# Altium schematic symbol library LATTICEPLDS_Library.SchLib: 291 symbols (part 30 of 32)
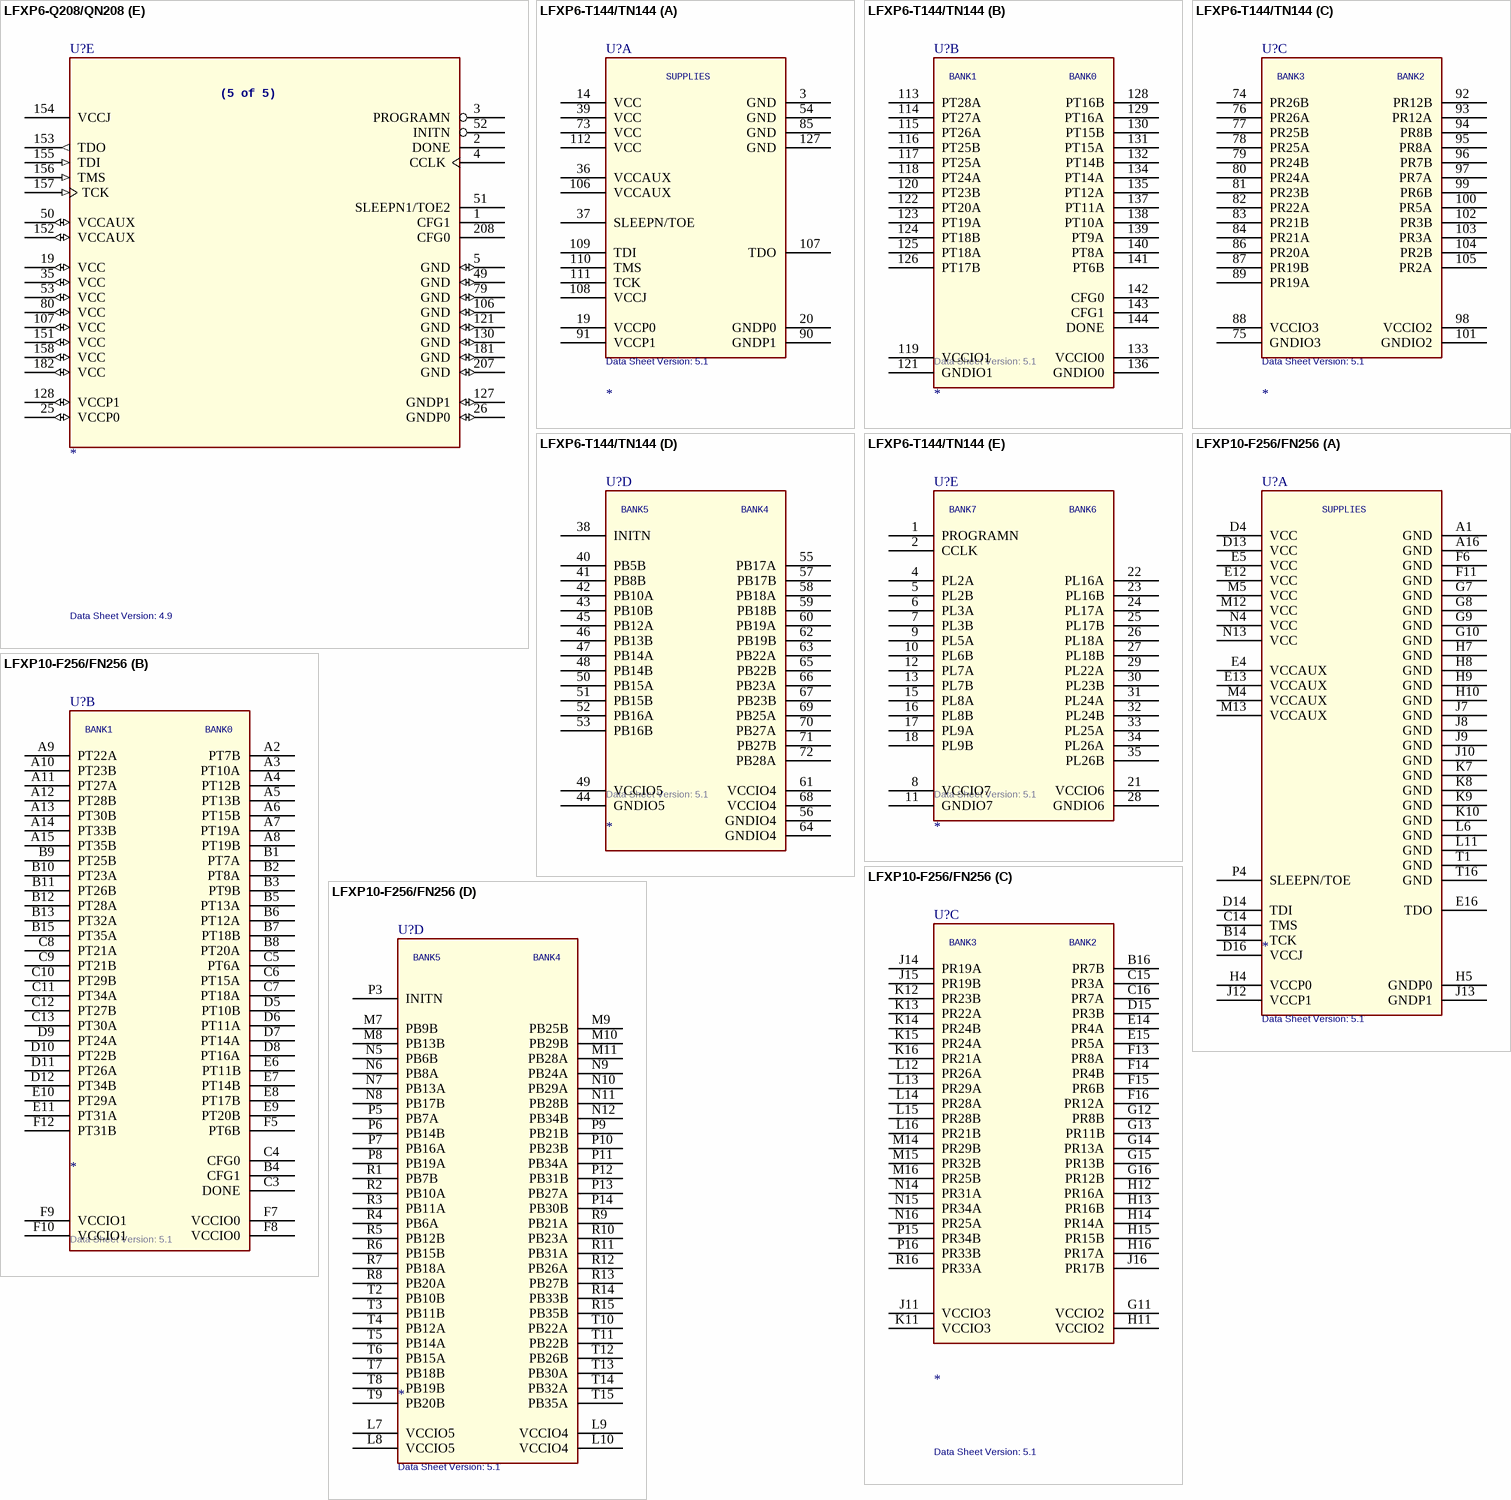
[diagram p332: symbols LFXP6-Q208/QN208 to LFXP10-F256/FN256]

## LFXP6-T144/TN144
designator U?  Data Sheet Version: 5.1
SPLIT_INST: TRUE; SWAP_INFO: (S1+S2+S3+S4+S5)
part A pins: 3 GND (power), 14 VCC (power), 19 VCCP0 (power), 20 GNDP0 (power), 36 VCCAUX (power), 37 SLEEPN/TOE, 39 VCC (power), 54 GND (power), 73 VCC (power), 85 GND (power), 90 GNDP1 (power), 91 VCCP1 (power), 106 VCCAUX (power), 107 TDO, 108 VCCJ (power), 109 TDI, 110 TMS, 111 TCK, 112 VCC (power), 127 GND (power)
part B pins: 113 PT28A, 114 PT27A, 115 PT26A, 116 PT25B, 117 PT25A, 118 PT24A, 119 VCCIO1 (power), 120 PT23B, 121 GNDIO1 (power), 122 PT20A, 123 PT19A, 124 PT18B, 125 PT18A, 126 PT17B, 128 PT16B, 129 PT16A, 130 PT15B, 131 PT15A, 132 PT14B, 133 VCCIO0 (power), 134 PT14A, 135 PT12A, 136 GNDIO0 (power), 137 PT11A, 138 PT10A, 139 PT9A, 140 PT8A, 141 PT6B, 142 CFG0, 143 CFG1, 144 DONE
part C pins: 74 PR26B, 75 GNDIO3 (power), 76 PR26A, 77 PR25B, 78 PR25A, 79 PR24B, 80 PR24A, 81 PR23B, 82 PR22A, 83 PR21B, 84 PR21A, 86 PR20A, 87 PR19B, 88 VCCIO3 (power), 89 PR19A, 92 PR12B, 93 PR12A, 94 PR8B, 95 PR8A, 96 PR7B, 97 PR7A, 98 VCCIO2 (power), 99 PR6B, 100 PR5A, 101 GNDIO2 (power), 102 PR3B, 103 PR3A, 104 PR2B, 105 PR2A
part D pins: 38 INITN, 40 PB5B, 41 PB8B, 42 PB10A, 43 PB10B, 44 GNDIO5 (power), 45 PB12A, 46 PB13B, 47 PB14A, 48 PB14B, 49 VCCIO5 (power), 50 PB15A, 51 PB15B, 52 PB16A, 53 PB16B, 55 PB17A, 56 GNDIO4 (power), 57 PB17B, 58 PB18A, 59 PB18B, 60 PB19A, 61 VCCIO4 (power), 62 PB19B, 63 PB22A, 64 GNDIO4 (power), 65 PB22B, 66 PB23A, 67 PB23B, 68 VCCIO4 (power), 69 PB25A, 70 PB27A, 71 PB27B, 72 PB28A
part E pins: 1 PROGRAMN, 2 CCLK, 4 PL2A, 5 PL2B, 6 PL3A, 7 PL3B, 8 VCCIO7 (power), 9 PL5A, 10 PL6B, 11 GNDIO7 (power), 12 PL7A, 13 PL7B, 15 PL8A, 16 PL8B, 17 PL9A, 18 PL9B, 21 VCCIO6 (power), 22 PL16A, 23 PL16B, 24 PL17A, 25 PL17B, 26 PL18A, 27 PL18B, 28 GNDIO6 (power), 29 PL22A, 30 PL23B, 31 PL24A, 32 PL24B, 33 PL25A, 34 PL26A, 35 PL26B
part A text: SUPPLIES
part B text: BANK1; BANK0
part C text: BANK3; BANK2
part D text: BANK5; BANK4
part E text: BANK7; BANK6

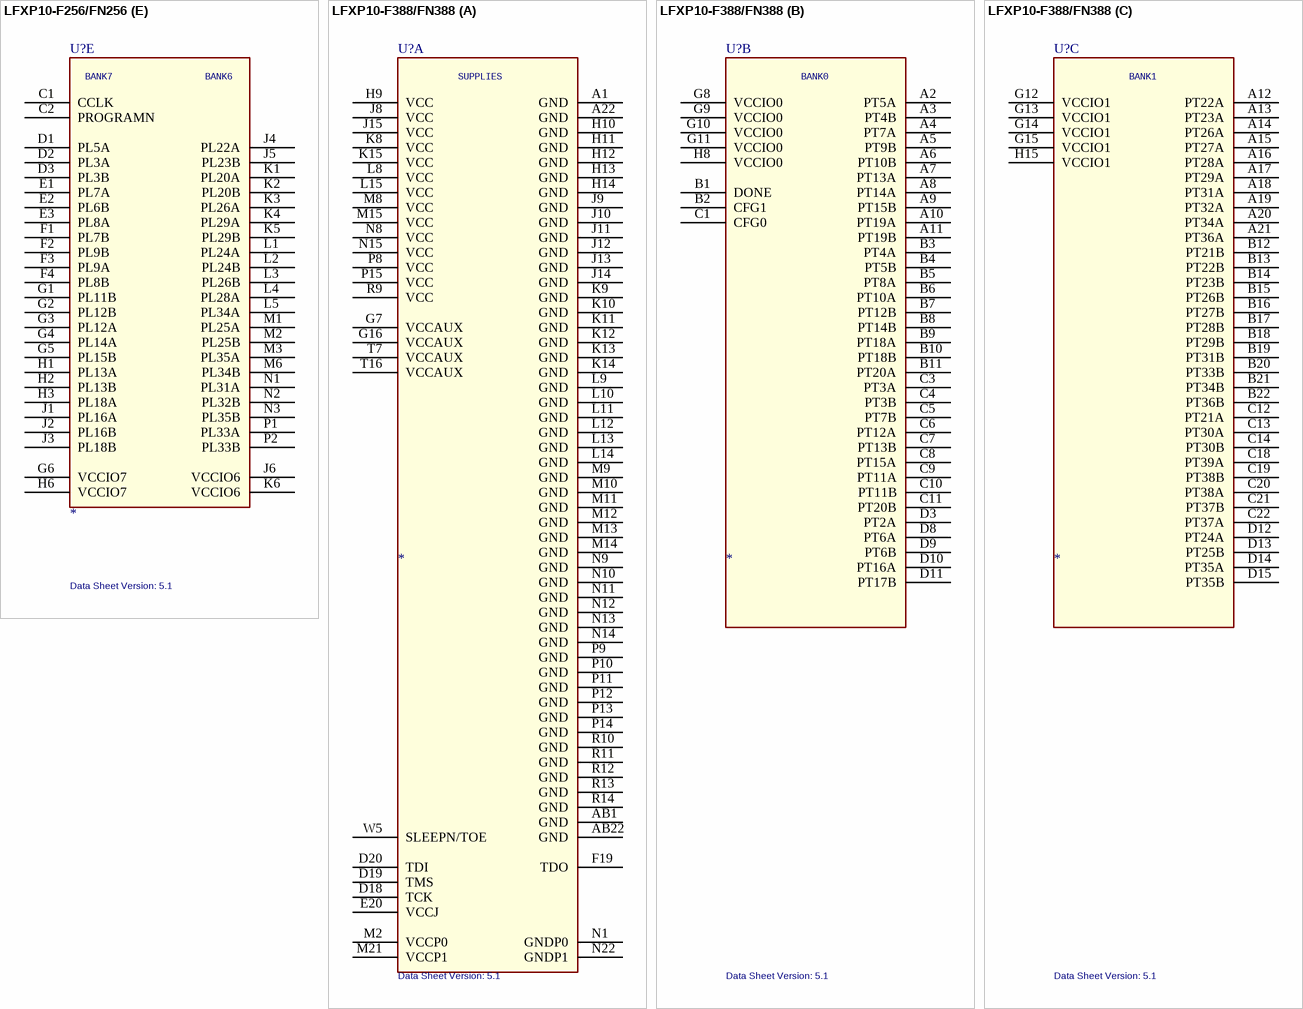
[diagram p270: symbols LFXP10-F256/FN256 to LFXP10-F388/FN388]

## LFXP10-F256/FN256
designator U?  Data Sheet Version: 5.1
SPLIT_INST: TRUE; SWAP_INFO: (S1+S2+S3+S4+S5)
part A pins: A1 GND (power), A16 GND (power), B14 TCK, C14 TMS, D4 VCC (power), D13 VCC (power), D14 TDI, D16 VCCJ (power), E4 VCCAUX (power), E5 VCC (power), E12 VCC (power), E13 VCCAUX (power), E16 TDO, F6 GND (power), F11 GND (power), G7 GND (power), G8 GND (power), G9 GND (power), G10 GND (power), H4 VCCP0 (power), H5 GNDP0 (power), H7 GND (power), H8 GND (power), H9 GND (power), H10 GND (power), J7 GND (power), J8 GND (power), J9 GND (power), J10 GND (power), J12 VCCP1 (power), J13 GNDP1 (power), K7 GND (power), K8 GND (power), K9 GND (power), K10 GND (power), L6 GND (power), L11 GND (power), M4 VCCAUX (power), M5 VCC (power), M12 VCC (power), M13 VCCAUX (power), N4 VCC (power), N13 VCC (power), P4 SLEEPN/TOE, T1 GND (power), T16 GND (power)
part B pins: A2 PT7B, A3 PT10A, A4 PT12B, A5 PT13B, A6 PT15B, A7 PT19A, A8 PT19B, A9 PT22A, A10 PT23B, A11 PT27A, A12 PT28B, A13 PT30B, A14 PT33B, A15 PT35B, B1 PT7A, B2 PT8A, B3 PT9B, B4 CFG1, B5 PT13A, B6 PT12A, B7 PT18B, B8 PT20A, B9 PT25B, B10 PT23A, B11 PT26B, B12 PT28A, B13 PT32A, B15 PT35A, C3 DONE, C4 CFG0, C5 PT6A, C6 PT15A, C7 PT18A, C8 PT21A, C9 PT21B, C10 PT29B, C11 PT34A, C12 PT27B, C13 PT30A, D5 PT10B, D6 PT11A, D7 PT14A, D8 PT16A, D9 PT24A, D10 PT22B, D11 PT26A, D12 PT34B, E6 PT11B, E7 PT14B, E8 PT17B, E9 PT20B, E10 PT29A, E11 PT31A, F5 PT6B, F7 VCCIO0 (power), F8 VCCIO0 (power), F9 VCCIO1 (power), F10 VCCIO1 (power), F12 PT31B
part C pins: B16 PR7B, C15 PR3A, C16 PR7A, D15 PR3B, E14 PR4A, E15 PR5A, F13 PR8A, F14 PR4B, F15 PR6B, F16 PR12A, G11 VCCIO2 (power), G12 PR8B, G13 PR11B, G14 PR13A, G15 PR13B, G16 PR12B, H11 VCCIO2 (power), H12 PR16A, H13 PR16B, H14 PR14A, H15 PR15B, H16 PR17A, J11 VCCIO3 (power), J14 PR19A, J15 PR19B, J16 PR17B, K11 VCCIO3 (power), K12 PR23B, K13 PR22A, K14 PR24B, K15 PR24A, K16 PR21A, L12 PR26A, L13 PR29A, L14 PR28A, L15 PR28B, L16 PR21B, M14 PR29B, M15 PR32B, M16 PR25B, N14 PR31A, N15 PR34A, N16 PR25A, P15 PR34B, P16 PR33B, R16 PR33A
part D pins: L7 VCCIO5 (power), L8 VCCIO5 (power), L9 VCCIO4 (power), L10 VCCIO4 (power), M7 PB9B, M8 PB13B, M9 PB25B, M10 PB29B, M11 PB28A, N5 PB6B, N6 PB8A, N7 PB13A, N8 PB17B, N9 PB24A, N10 PB29A, N11 PB28B, N12 PB34B, P3 INITN, P5 PB7A, P6 PB14B, P7 PB16A, P8 PB19A, P9 PB21B, P10 PB23B, P11 PB34A, P12 PB31B, P13 PB27A, P14 PB30B, R1 PB7B, R2 PB10A, R3 PB11A, R4 PB6A, R5 PB12B, R6 PB15B, R7 PB18A, R8 PB20A, R9 PB21A, R10 PB23A, R11 PB31A, R12 PB26A, R13 PB27B, R14 PB33B, R15 PB35B, T2 PB10B, T3 PB11B, T4 PB12A, T5 PB14A, T6 PB15A, T7 PB18B, T8 PB19B, T9 PB20B, T10 PB22A, T11 PB22B, T12 PB26B, T13 PB30A, T14 PB32A, T15 PB35A
part E pins: C1 CCLK, C2 PROGRAMN, D1 PL5A, D2 PL3A, D3 PL3B, E1 PL7A, E2 PL6B, E3 PL8A, F1 PL7B, F2 PL9B, F3 PL9A, F4 PL8B, G1 PL11B, G2 PL12B, G3 PL12A, G4 PL14A, G5 PL15B, G6 VCCIO7 (power), H1 PL13A, H2 PL13B, H3 PL18A, H6 VCCIO7 (power), J1 PL16A, J2 PL16B, J3 PL18B, J4 PL22A, J5 PL23B, J6 VCCIO6 (power), K1 PL20A, K2 PL20B, K3 PL26A, K4 PL29A, K5 PL29B, K6 VCCIO6 (power), L1 PL24A, L2 PL24B, L3 PL26B, L4 PL28A, L5 PL34A, M1 PL25A, M2 PL25B, M3 PL35A, M6 PL34B, N1 PL31A, N2 PL32B, N3 PL35B, P1 PL33A, P2 PL33B
part A text: SUPPLIES
part B text: BANK1; BANK0
part C text: BANK3; BANK2
part D text: BANK5; BANK4
part E text: BANK7; BANK6

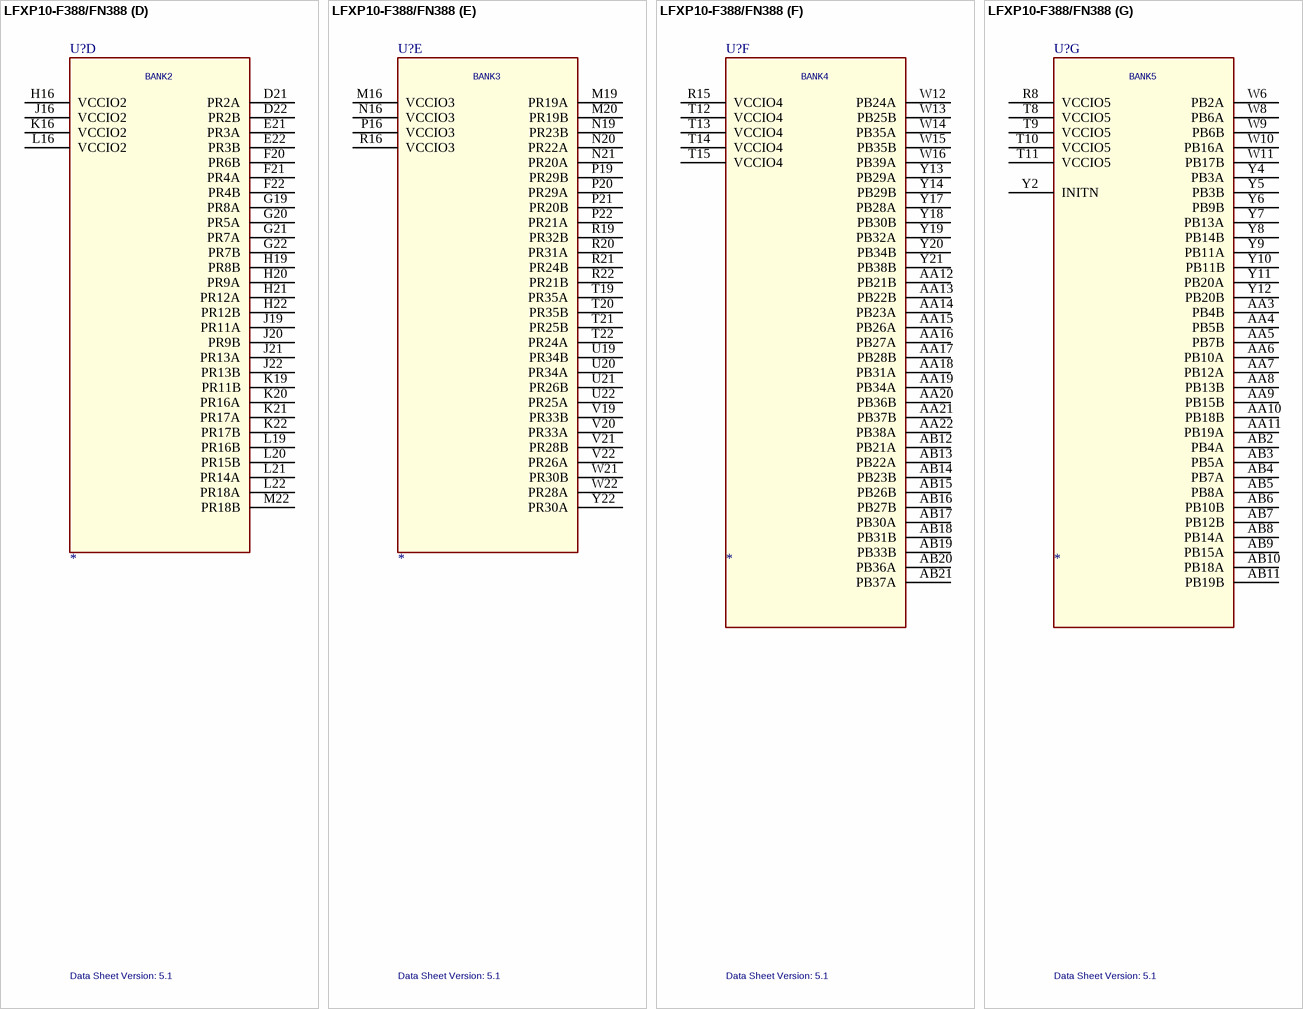
[diagram p271: symbol LFXP10-F388/FN388]

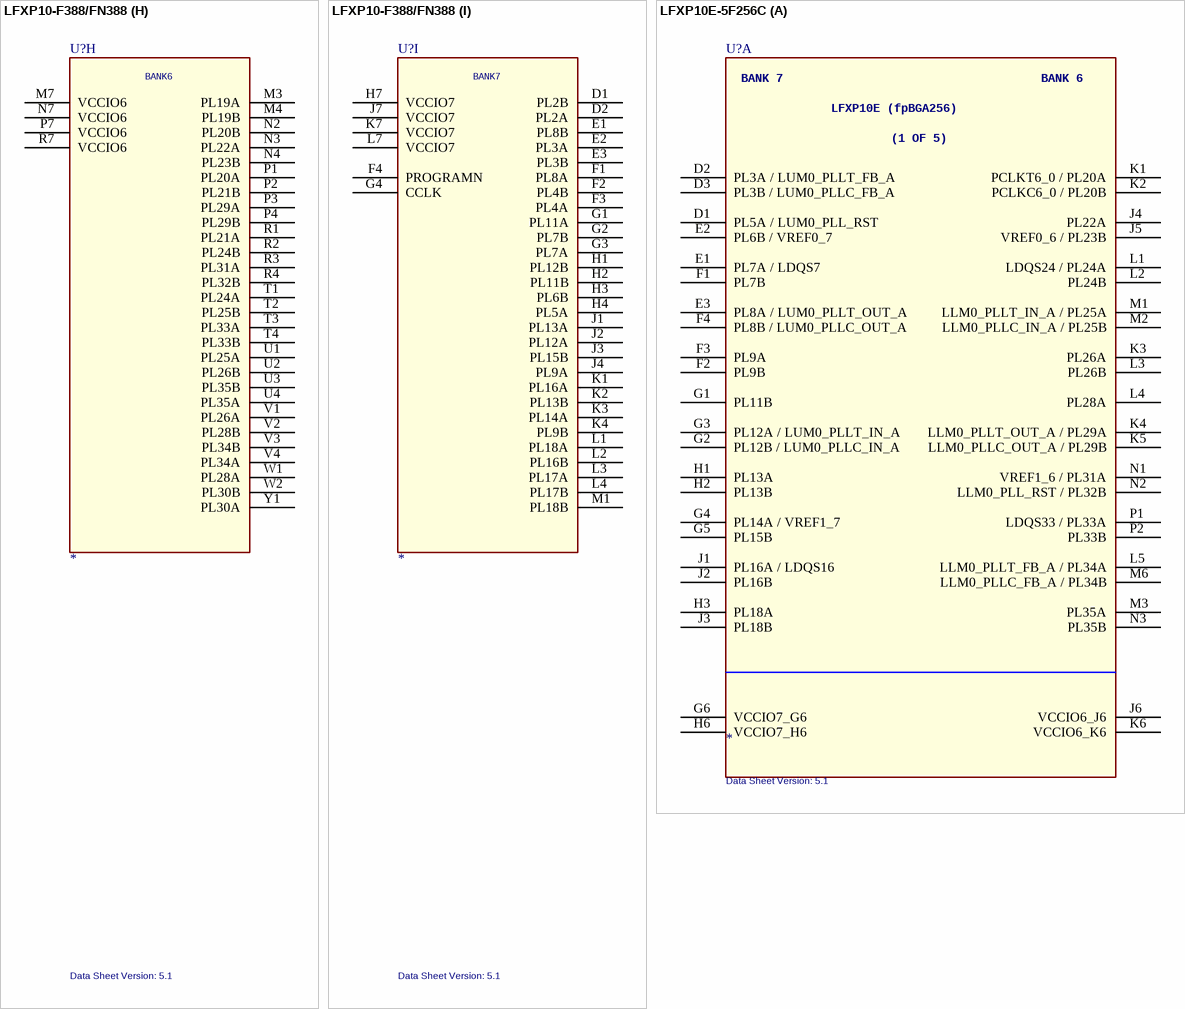
[diagram p272: symbols LFXP10-F388/FN388 to LFXP10E-5F256C]

## LFXP10-F388/FN388
designator U?  Data Sheet Version: 5.1
SPLIT_INST: TRUE; SWAP_INFO: (S1+S2+S3+S4+S5+S6+S7+S8+S9)
part A pins: A1 GND (power), A22 GND (power), AB1 GND (power), AB22 GND (power), D18 TCK, D19 TMS, D20 TDI, E20 VCCJ (power), F19 TDO, G7 VCCAUX (power), G16 VCCAUX (power), H9 VCC (power), H10 GND (power), H11 GND (power), H12 GND (power), H13 GND (power), H14 GND (power), J8 VCC (power), J9 GND (power), J10 GND (power), J11 GND (power), J12 GND (power), J13 GND (power), J14 GND (power), J15 VCC (power), K8 VCC (power), K9 GND (power), K10 GND (power), K11 GND (power), K12 GND (power), K13 GND (power), K14 GND (power), K15 VCC (power), L8 VCC (power), L9 GND (power), L10 GND (power), L11 GND (power), L12 GND (power), L13 GND (power), L14 GND (power), L15 VCC (power), M2 VCCP0 (power), M8 VCC (power), M9 GND (power), M10 GND (power), M11 GND (power), M12 GND (power), M13 GND (power), M14 GND (power), M15 VCC (power), M21 VCCP1 (power), N1 GNDP0 (power), N8 VCC (power), N9 GND (power), N10 GND (power), N11 GND (power), N12 GND (power), N13 GND (power), N14 GND (power), N15 VCC (power), N22 GNDP1 (power), P8 VCC (power), P9 GND (power), P10 GND (power), P11 GND (power), P12 GND (power), P13 GND (power), P14 GND (power), P15 VCC (power), R9 VCC (power), R10 GND (power), R11 GND (power), R12 GND (power), R13 GND (power), R14 GND (power), T7 VCCAUX (power), T16 VCCAUX (power), W5 SLEEPN/TOE
part B pins: A2 PT5A, A3 PT4B, A4 PT7A, A5 PT9B, A6 PT10B, A7 PT13A, A8 PT14A, A9 PT15B, A10 PT19A, A11 PT19B, B1 DONE, B2 CFG1, B3 PT4A, B4 PT5B, B5 PT8A, B6 PT10A, B7 PT12B, B8 PT14B, B9 PT18A, B10 PT18B, B11 PT20A, C1 CFG0, C3 PT3A, C4 PT3B, C5 PT7B, C6 PT12A, C7 PT13B, C8 PT15A, C9 PT11A, C10 PT11B, C11 PT20B, D3 PT2A, D8 PT6A, D9 PT6B, D10 PT16A, D11 PT17B, G8 VCCIO0 (power), G9 VCCIO0 (power), G10 VCCIO0 (power), G11 VCCIO0 (power), H8 VCCIO0 (power)
part C pins: A12 PT22A, A13 PT23A, A14 PT26A, A15 PT27A, A16 PT28A, A17 PT29A, A18 PT31A, A19 PT32A, A20 PT34A, A21 PT36A, B12 PT21B, B13 PT22B, B14 PT23B, B15 PT26B, B16 PT27B, B17 PT28B, B18 PT29B, B19 PT31B, B20 PT33B, B21 PT34B, B22 PT36B, C12 PT21A, C13 PT30A, C14 PT30B, C18 PT39A, C19 PT38B, C20 PT38A, C21 PT37B, C22 PT37A, D12 PT24A, D13 PT25B, D14 PT35A, D15 PT35B, G12 VCCIO1 (power), G13 VCCIO1 (power), G14 VCCIO1 (power), G15 VCCIO1 (power), H15 VCCIO1 (power)
part D pins: D21 PR2A, D22 PR2B, E21 PR3A, E22 PR3B, F20 PR6B, F21 PR4A, F22 PR4B, G19 PR8A, G20 PR5A, G21 PR7A, G22 PR7B, H16 VCCIO2 (power), H19 PR8B, H20 PR9A, H21 PR12A, H22 PR12B, J16 VCCIO2 (power), J19 PR11A, J20 PR9B, J21 PR13A, J22 PR13B, K16 VCCIO2 (power), K19 PR11B, K20 PR16A, K21 PR17A, K22 PR17B, L16 VCCIO2 (power), L19 PR16B, L20 PR15B, L21 PR14A, L22 PR18A, M22 PR18B
part E pins: M16 VCCIO3 (power), M19 PR19A, M20 PR19B, N16 VCCIO3 (power), N19 PR23B, N20 PR22A, N21 PR20A, P16 VCCIO3 (power), P19 PR29B, P20 PR29A, P21 PR20B, P22 PR21A, R16 VCCIO3 (power), R19 PR32B, R20 PR31A, R21 PR24B, R22 PR21B, T19 PR35A, T20 PR35B, T21 PR25B, T22 PR24A, U19 PR34B, U20 PR34A, U21 PR26B, U22 PR25A, V19 PR33B, V20 PR33A, V21 PR28B, V22 PR26A, W21 PR30B, W22 PR28A, Y22 PR30A
part F pins: AA12 PB21B, AA13 PB22B, AA14 PB23A, AA15 PB26A, AA16 PB27A, AA17 PB28B, AA18 PB31A, AA19 PB34A, AA20 PB36B, AA21 PB37B, AA22 PB38A, AB12 PB21A, AB13 PB22A, AB14 PB23B, AB15 PB26B, AB16 PB27B, AB17 PB30A, AB18 PB31B, AB19 PB33B, AB20 PB36A, AB21 PB37A, R15 VCCIO4 (power), T12 VCCIO4 (power), T13 VCCIO4 (power), T14 VCCIO4 (power), T15 VCCIO4 (power), W12 PB24A, W13 PB25B, W14 PB35A, W15 PB35B, W16 PB39A, Y13 PB29A, Y14 PB29B, Y17 PB28A, Y18 PB30B, Y19 PB32A, Y20 PB34B, Y21 PB38B
part G pins: AA3 PB4B, AA4 PB5B, AA5 PB7B, AA6 PB10A, AA7 PB12A, AA8 PB13B, AA9 PB15B, AA10 PB18B, AA11 PB19A, AB2 PB4A, AB3 PB5A, AB4 PB7A, AB5 PB8A, AB6 PB10B, AB7 PB12B, AB8 PB14A, AB9 PB15A, AB10 PB18A, AB11 PB19B, R8 VCCIO5 (power), T8 VCCIO5 (power), T9 VCCIO5 (power), T10 VCCIO5 (power), T11 VCCIO5 (power), W6 PB2A, W8 PB6A, W9 PB6B, W10 PB16A, W11 PB17B, Y2 INITN, Y4 PB3A, Y5 PB3B, Y6 PB9B, Y7 PB13A, Y8 PB14B, Y9 PB11A, Y10 PB11B, Y11 PB20A, Y12 PB20B
part H pins: M3 PL19A, M4 PL19B, M7 VCCIO6 (power), N2 PL20B, N3 PL22A, N4 PL23B, N7 VCCIO6 (power), P1 PL20A, P2 PL21B, P3 PL29A, P4 PL29B, P7 VCCIO6 (power), R1 PL21A, R2 PL24B, R3 PL31A, R4 PL32B, R7 VCCIO6 (power), T1 PL24A, T2 PL25B, T3 PL33A, T4 PL33B, U1 PL25A, U2 PL26B, U3 PL35B, U4 PL35A, V1 PL26A, V2 PL28B, V3 PL34B, V4 PL34A, W1 PL28A, W2 PL30B, Y1 PL30A
part I pins: D1 PL2B, D2 PL2A, E1 PL8B, E2 PL3A, E3 PL3B, F1 PL8A, F2 PL4B, F3 PL4A, F4 PROGRAMN, G1 PL11A, G2 PL7B, G3 PL7A, G4 CCLK, H1 PL12B, H2 PL11B, H3 PL6B, H4 PL5A, H7 VCCIO7 (power), J1 PL13A, J2 PL12A, J3 PL15B, J4 PL9A, J7 VCCIO7 (power), K1 PL16A, K2 PL13B, K3 PL14A, K4 PL9B, K7 VCCIO7 (power), L1 PL18A, L2 PL16B, L3 PL17A, L4 PL17B, L7 VCCIO7 (power), M1 PL18B
part A text: SUPPLIES
part B text: BANK0
part C text: BANK1
part D text: BANK2
part E text: BANK3
part F text: BANK4
part G text: BANK5
part H text: BANK6
part I text: BANK7

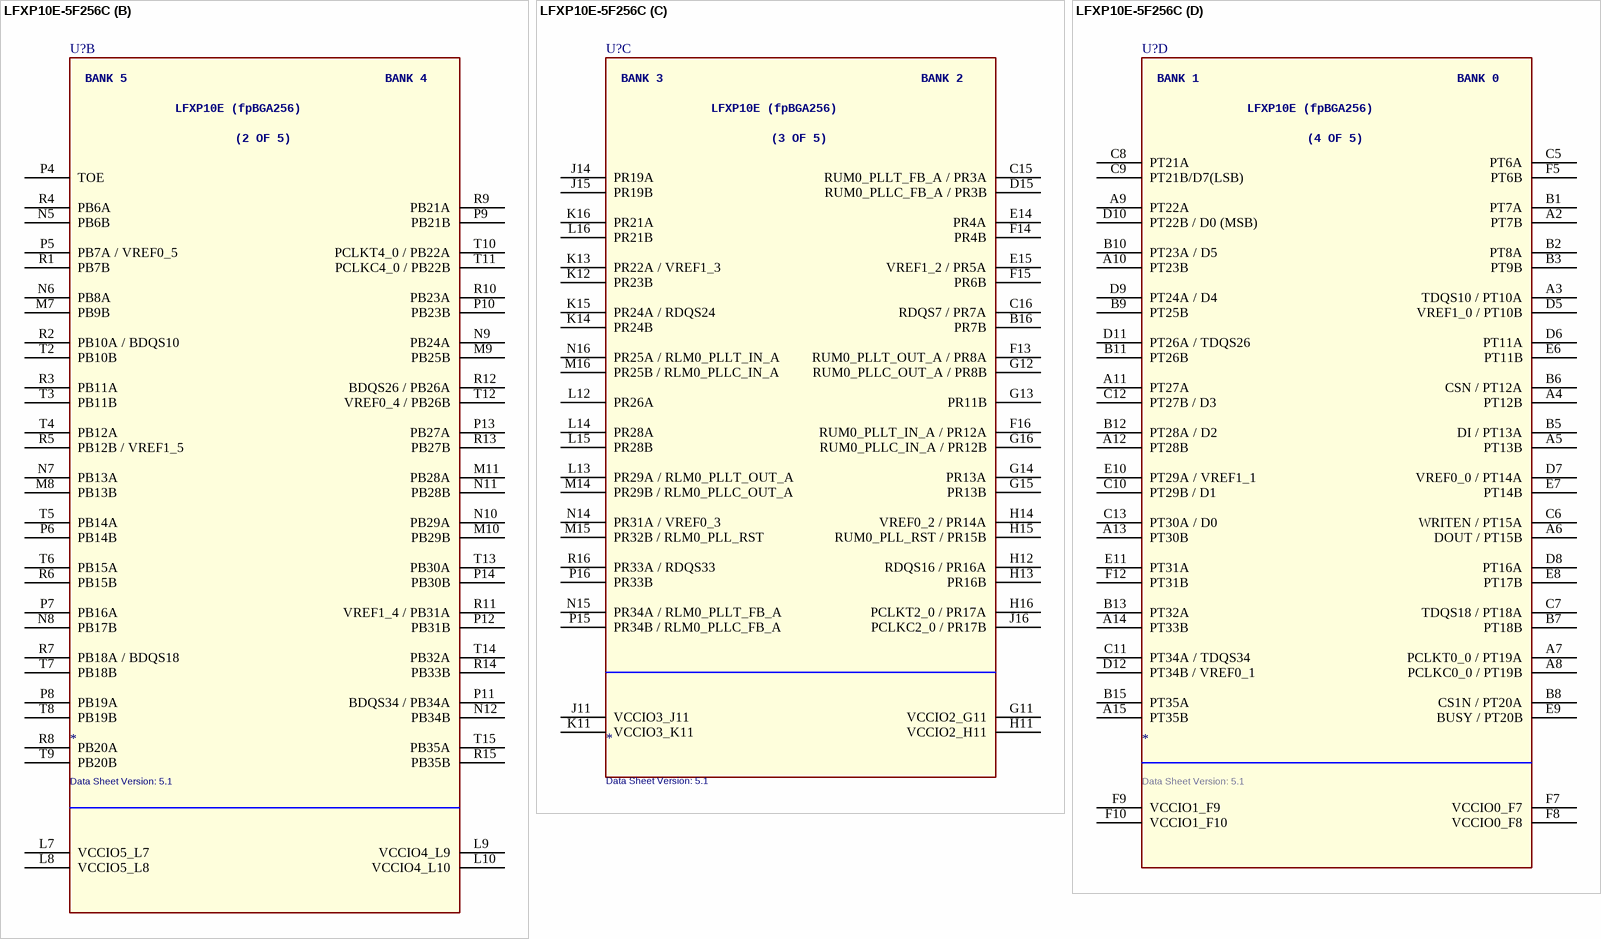
[diagram p273: symbol LFXP10E-5F256C]

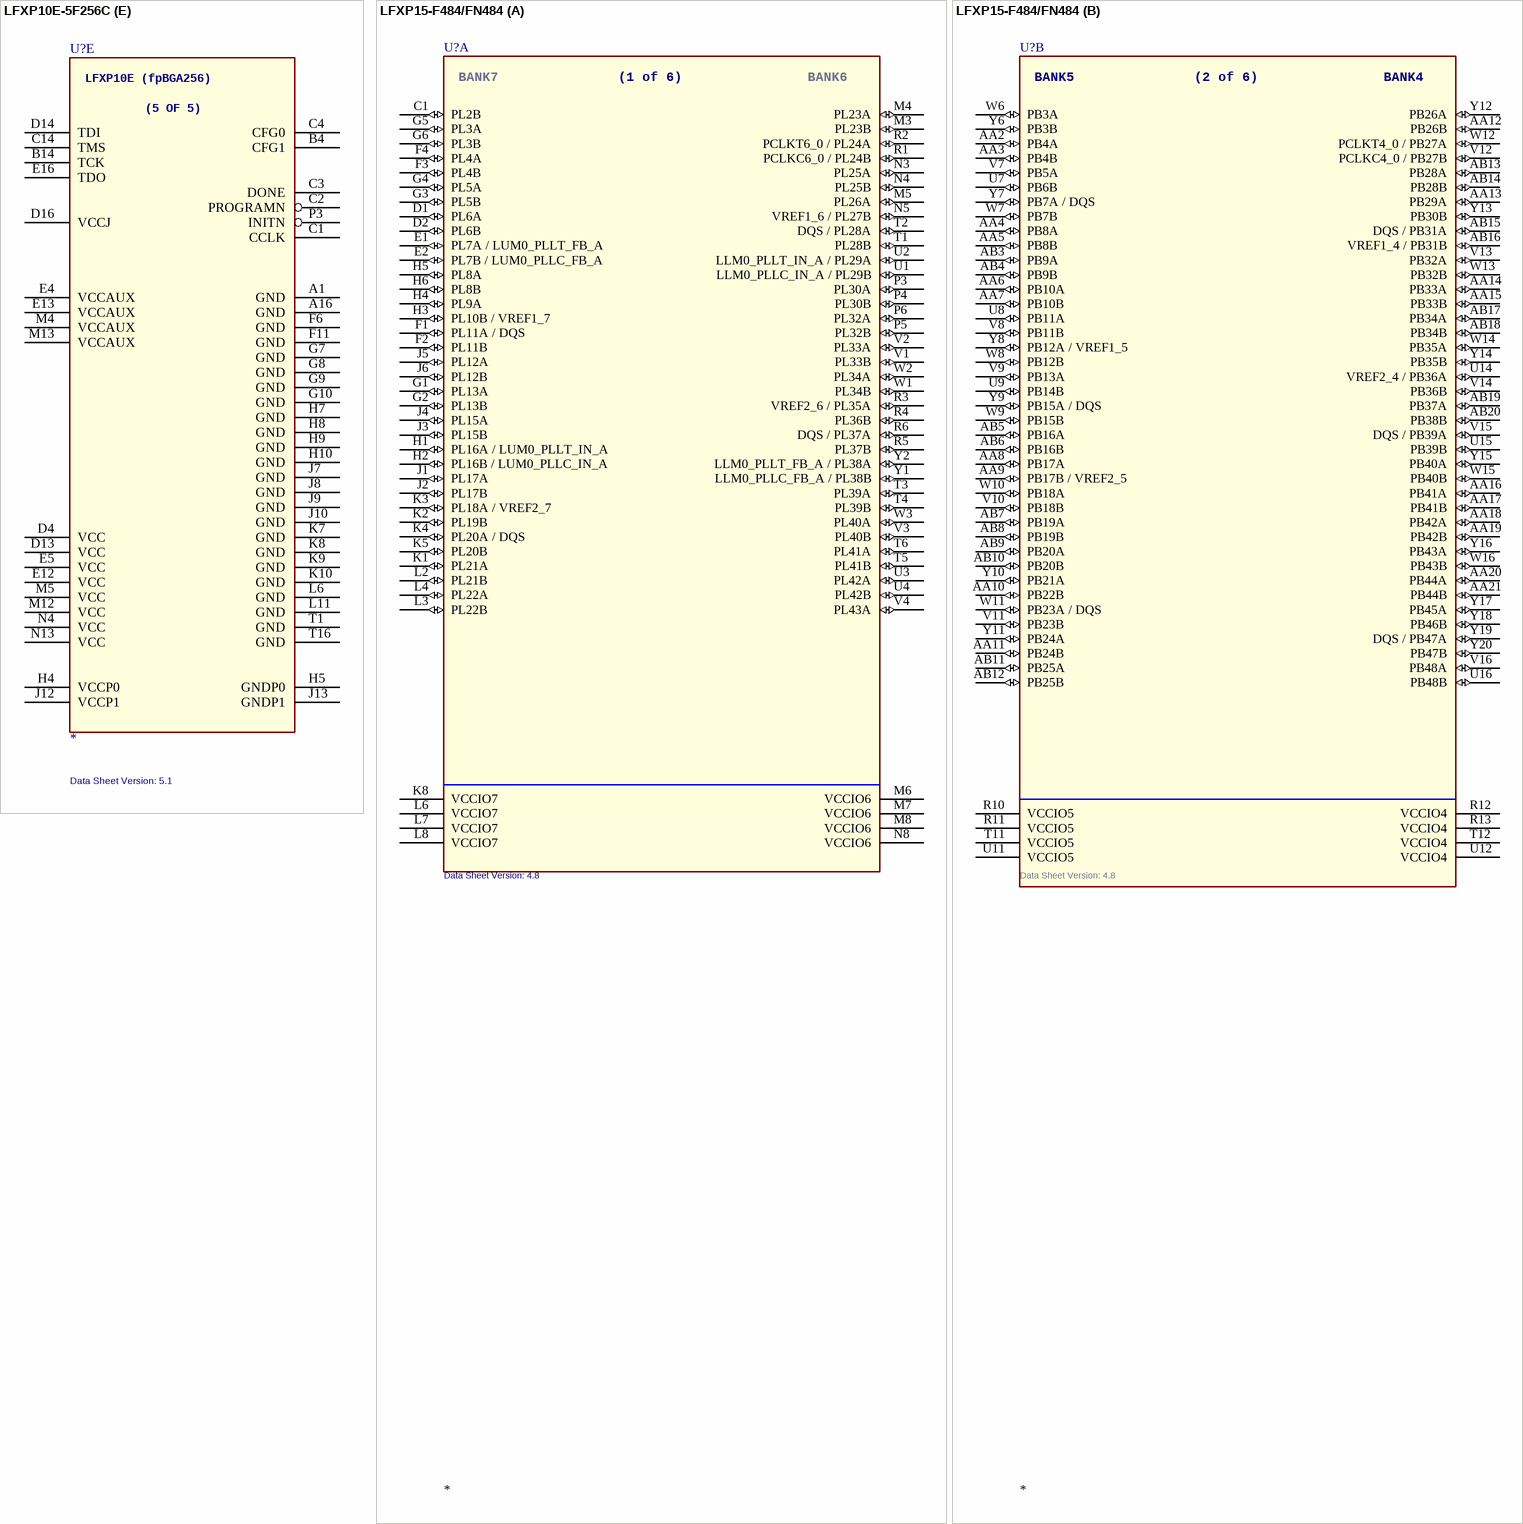
[diagram p274: symbols LFXP10E-5F256C to LFXP15-F484/FN484]

## LFXP10E-5F256C
designator U?  Data Sheet Version: 5.1
footprint FPBGA256
part A pins: D1 PL5A / LUM0_PLL_RST, D2 PL3A / LUM0_PLLT_FB_A, D3 PL3B / LUM0_PLLC_FB_A, E1 PL7A / LDQS7, E2 PL6B / VREF0_7, E3 PL8A / LUM0_PLLT_OUT_A, F1 PL7B, F2 PL9B, F3 PL9A, F4 PL8B / LUM0_PLLC_OUT_A, G1 PL11B, G2 PL12B / LUM0_PLLC_IN_A, G3 PL12A / LUM0_PLLT_IN_A, G4 PL14A / VREF1_7, G5 PL15B, G6 VCCIO7_G6 (power), H1 PL13A, H2 PL13B, H3 PL18A, H6 VCCIO7_H6 (power), J1 PL16A / LDQS16, J2 PL16B, J3 PL18B, J4 PL22A, J5 VREF0_6 / PL23B, J6 VCCIO6_J6 (power), K1 PCLKT6_0 / PL20A, K2 PCLKC6_0 / PL20B, K3 PL26A, K4 LLM0_PLLT_OUT_A / PL29A, K5 LLM0_PLLC_OUT_A / PL29B, K6 VCCIO6_K6 (power), L1 LDQS24 / PL24A, L2 PL24B, L3 PL26B, L4 PL28A, L5 LLM0_PLLT_FB_A / PL34A, M1 LLM0_PLLT_IN_A / PL25A, M2 LLM0_PLLC_IN_A / PL25B, M3 PL35A, M6 LLM0_PLLC_FB_A / PL34B, N1 VREF1_6 / PL31A, N2 LLM0_PLL_RST / PL32B, N3 PL35B, P1 LDQS33 / PL33A, P2 PL33B
part B pins: L7 VCCIO5_L7 (power), L8 VCCIO5_L8 (power), L9 VCCIO4_L9 (power), L10 VCCIO4_L10 (power), M7 PB9B, M8 PB13B, M9 PB25B, M10 PB29B, M11 PB28A, N5 PB6B, N6 PB8A, N7 PB13A, N8 PB17B, N9 PB24A, N10 PB29A, N11 PB28B, N12 PB34B, P4 TOE, P5 PB7A / VREF0_5, P6 PB14B, P7 PB16A, P8 PB19A, P9 PB21B, P10 PB23B, P11 BDQS34 / PB34A, P12 PB31B, P13 PB27A, P14 PB30B, R1 PB7B, R2 PB10A / BDQS10, R3 PB11A, R4 PB6A, R5 PB12B / VREF1_5, R6 PB15B, R7 PB18A / BDQS18, R8 PB20A, R9 PB21A, R10 PB23A, R11 VREF1_4 / PB31A, R12 BDQS26 / PB26A, R13 PB27B, R14 PB33B, R15 PB35B, T2 PB10B, T3 PB11B, T4 PB12A, T5 PB14A, T6 PB15A, T7 PB18B, T8 PB19B, T9 PB20B, T10 PCLKT4_0 / PB22A, T11 PCLKC4_0 / PB22B, T12 VREF0_4 / PB26B, T13 PB30A, T14 PB32A, T15 PB35A
part C pins: B16 PR7B, C15 RUM0_PLLT_FB_A / PR3A, C16 RDQS7 / PR7A, D15 RUM0_PLLC_FB_A / PR3B, E14 PR4A, E15 VREF1_2 / PR5A, F13 RUM0_PLLT_OUT_A / PR8A, F14 PR4B, F15 PR6B, F16 RUM0_PLLT_IN_A / PR12A, G11 VCCIO2_G11 (power), G12 RUM0_PLLC_OUT_A / PR8B, G13 PR11B, G14 PR13A, G15 PR13B, G16 RUM0_PLLC_IN_A / PR12B, H11 VCCIO2_H11 (power), H12 RDQS16 / PR16A, H13 PR16B, H14 VREF0_2 / PR14A, H15 RUM0_PLL_RST / PR15B, H16 PCLKT2_0 / PR17A, J11 VCCIO3_J11 (power), J14 PR19A, J15 PR19B, J16 PCLKC2_0 / PR17B, K11 VCCIO3_K11 (power), K12 PR23B, K13 PR22A / VREF1_3, K14 PR24B, K15 PR24A / RDQS24, K16 PR21A, L12 PR26A, L13 PR29A / RLM0_PLLT_OUT_A, L14 PR28A, L15 PR28B, L16 PR21B, M14 PR29B / RLM0_PLLC_OUT_A, M15 PR32B / RLM0_PLL_RST, M16 PR25B / RLM0_PLLC_IN_A, N14 PR31A / VREF0_3, N15 PR34A / RLM0_PLLT_FB_A, N16 PR25A / RLM0_PLLT_IN_A, P15 PR34B / RLM0_PLLC_FB_A, P16 PR33B, R16 PR33A / RDQS33
part D pins: A2 PT7B, A3 TDQS10 / PT10A, A4 PT12B, A5 PT13B, A6 DOUT / PT15B, A7 PCLKT0_0 / PT19A, A8 PCLKC0_0 / PT19B, A9 PT22A, A10 PT23B, A11 PT27A, A12 PT28B, A13 PT30B, A14 PT33B, A15 PT35B, B1 PT7A, B2 PT8A, B3 PT9B, B5 DI / PT13A, B6 CSN / PT12A, B7 PT18B, B8 CS1N / PT20A, B9 PT25B, B10 PT23A / D5, B11 PT26B, B12 PT28A / D2, B13 PT32A, B15 PT35A, C5 PT6A, C6 WRITEN / PT15A, C7 TDQS18 / PT18A, C8 PT21A, C9 PT21B/D7(LSB), C10 PT29B / D1, C11 PT34A / TDQS34, C12 PT27B / D3, C13 PT30A / D0, D5 VREF1_0 / PT10B, D6 PT11A, D7 VREF0_0 / PT14A, D8 PT16A, D9 PT24A / D4, D10 PT22B / D0 (MSB), D11 PT26A / TDQS26, D12 PT34B / VREF0_1, E6 PT11B, E7 PT14B, E8 PT17B, E9 BUSY / PT20B, E10 PT29A / VREF1_1, E11 PT31A, F5 PT6B, F7 VCCIO0_F7 (power), F8 VCCIO0_F8 (power), F9 VCCIO1_F9 (power), F10 VCCIO1_F10 (power), F12 PT31B
part E pins: A1 GND (power), A16 GND (power), B4 CFG1, B14 TCK, C1 CCLK, C2 PROGRAMN, C3 DONE, C4 CFG0, C14 TMS, D4 VCC (power), D13 VCC (power), D14 TDI, D16 VCCJ (power), E4 VCCAUX (power), E5 VCC (power), E12 VCC (power), E13 VCCAUX (power), E16 TDO, F6 GND (power), F11 GND (power), G7 GND (power), G8 GND (power), G9 GND (power), G10 GND (power), H4 VCCP0 (power), H5 GNDP0 (power), H7 GND (power), H8 GND (power), H9 GND (power), H10 GND (power), J7 GND (power), J8 GND (power), J9 GND (power), J10 GND (power), J12 VCCP1 (power), J13 GNDP1 (power), K7 GND (power), K8 GND (power), K9 GND (power), K10 GND (power), L6 GND (power), L11 GND (power), M4 VCCAUX (power), M5 VCC (power), M12 VCC (power), M13 VCCAUX (power), N4 VCC (power), N13 VCC (power), P3 INITN, T1 GND (power), T16 GND (power)